# Altium footprint library IntLib.PcbLib: 221 footprints (part 9 of 14)
Each footprint in its own frame and in the unit in brackets; x right, y up, seen from the top. Pads: shape width x height; smd on the part's side, far side on the other; paste and mask are expansions set on the pad; w line width, h text height; cw(c..) or ccw(c..) is an arc to the next point about the centre after c.
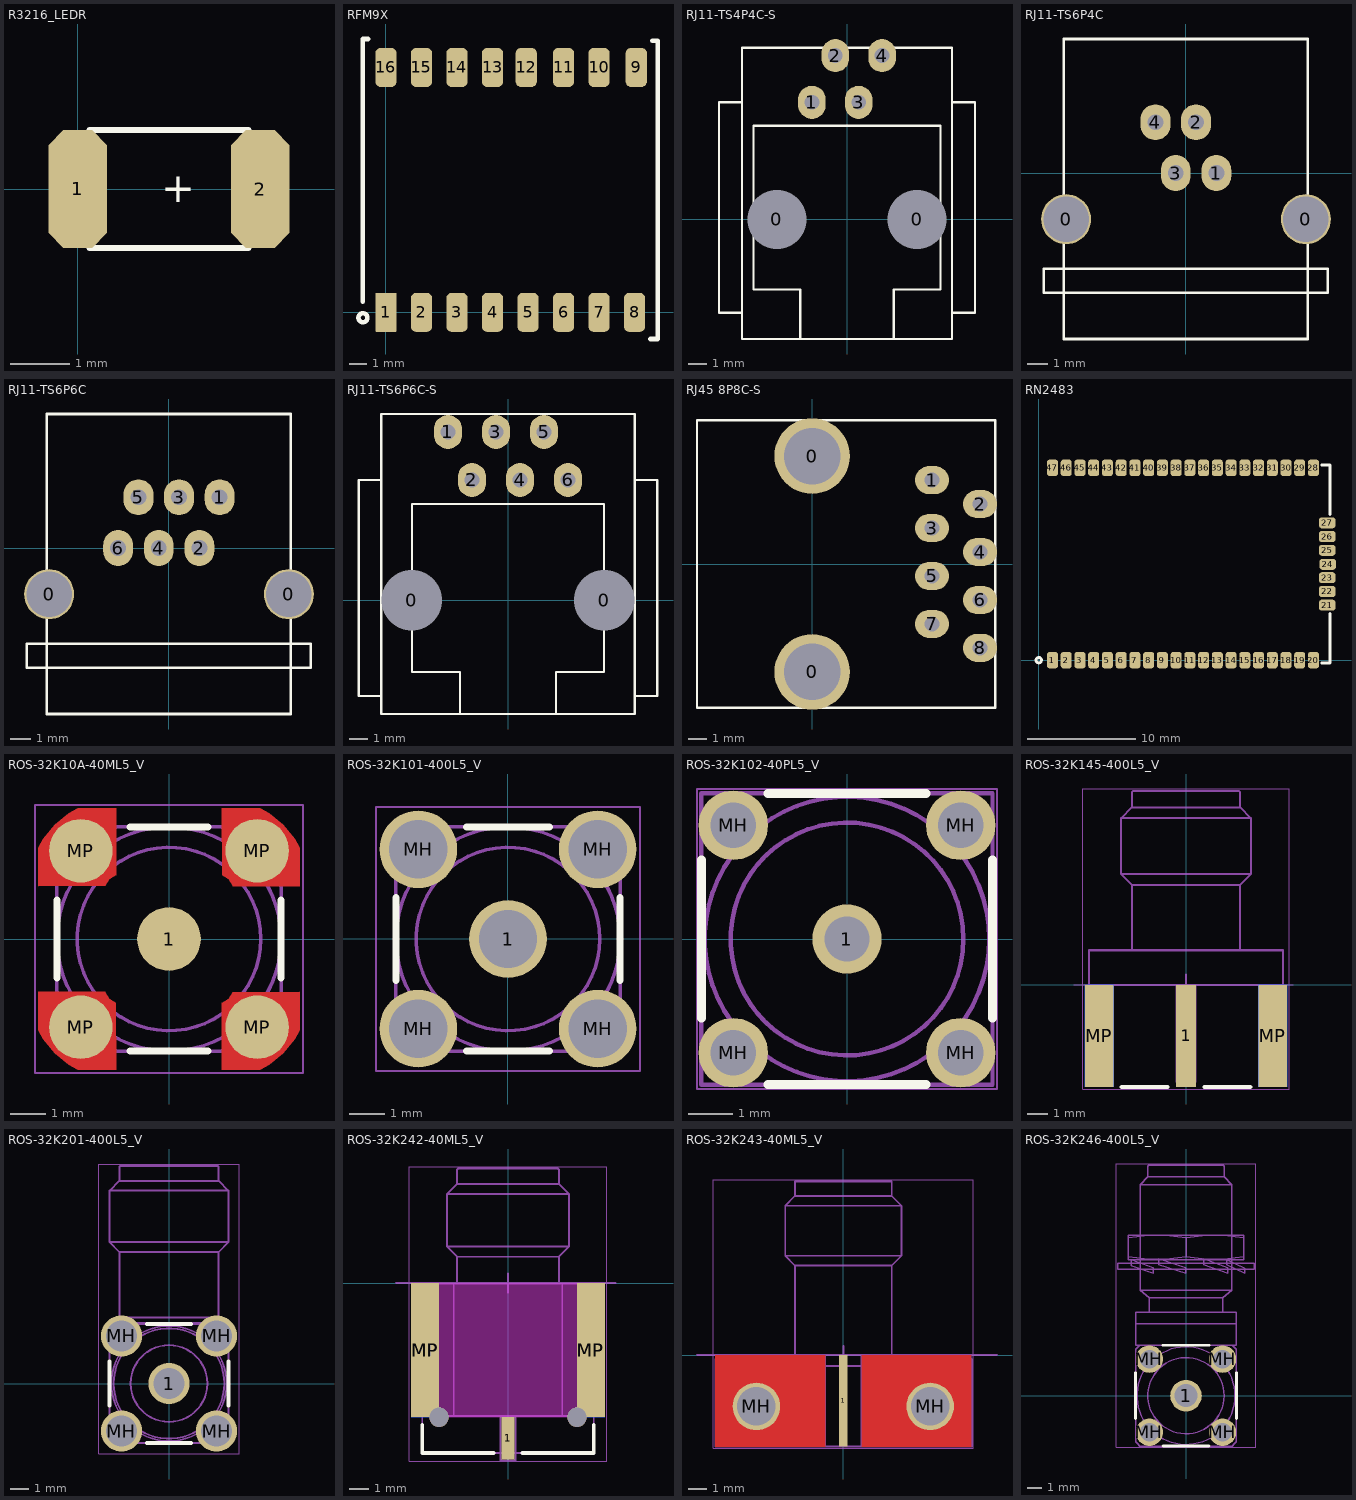
[diagram p8: the footprints below, top view; thin cyan lines are the x and y axes]

## R3216_LEDR [mm] "1206"
pads (2):
  oct 1x2 smd: 1(0,0) 2(3.1,0)
Top Overlay:
  lines w0.1: 0.2,-1 0.2,0 0.2,1 2.9,1 2.9,-1 0.2,-1
  text "+" at 1.422,-0.229 h0.5
3D body: height 1.11, standoff -0.4, extent -0.1,-0.8 3.1,0.8

## RFM9X [mm] "RFM95/96/97/98 Lora Hope RF 433/868"
pads (16):
  rrect10% 1.2x2.2 smd: 1(0,0)
  rrect50% 1.2x2.2 smd: 2(2,0) 3(4,0) 4(6,0) 5(8,0) 6(10,0) 7(12,0) 8(14,0) 9(14.1,13.8) 10(12,13.8) 11(10,13.8) 12(7.9,13.8) 13(6,13.8) 14(4,13.8) 15(2,13.8) 16(0,13.8)
Top Overlay:
  circle w0.254: c-1.3,-0.3 r0.254
  lines w0.254: -1.3,0.6 -1.3,15.4 -1,15.4 ; 14.9,-1.5 15.3,-1.5 15.3,15.3 15,15.3
3D body: height 2.29, standoff 0.06, extent -0.9,-1.1 15,14.902

## RJ11-TS4P4C-S [mm]
pads (6):
  round 3 hole 3.2: 0(-3.81,0) 0(3.81,0)
  oval 1.5x1.8 hole 0.8: 1(-1.905,6.35) 2(-0.635,8.89) 3(0.635,6.35) 4(1.905,8.89)
Top Overlay:
  lines w0.127: -5.7,-5.08 -6.95,-5.08 -6.95,6.35 -5.7,6.35 ; -2.54,-6.5 -2.54,-3.81 -5.08,-3.81 -5.08,5.08 5.08,5.08 5.08,-3.81 2.54,-3.81 2.54,-6.5 ; 5.7,-5.08 6.95,-5.08 6.95,6.35 5.7,6.35 ; -5.7,-6.5 -5.7,9.322 5.7,9.322 5.7,-6.5 -5.7,-6.5
3D body: height 16.31, standoff -4.92, extent -6.858,-6.553 6.858,9.322

## RJ11-TS6P4C [mm]
pads (6):
  round 2.5 hole 2.286: 0(-5.986,-2.311) 0(6.013,-2.311)
  oval 1.5x1.8 hole 0.8: 1(1.532,0) 2(0.516,2.54) 3(-0.5,0) 4(-1.516,2.54)
Top Overlay:
  lines w0.127: -7.099,-5.994 -7.099,-4.801 7.099,-4.801 7.099,-5.994 -7.099,-5.994 ; -6.096,-8.306 6.096,-8.306 6.096,6.706 -6.096,6.706 -6.096,-8.306
3D body: height 14.5, standoff -3.5, extent -7.182,-8.3 7.218,4.7

## RJ11-TS6P6C [mm]
pads (8):
  round 2.5 hole 2.286: 0(-5.986,-2.311) 0(6.013,-2.311)
  oval 1.5x1.8 hole 0.8: 1(2.548,2.54) 2(1.532,0) 3(0.516,2.54) 4(-0.5,0) 5(-1.516,2.54) 6(-2.532,0)
Top Overlay:
  lines w0.127: -7.099,-5.994 -7.099,-4.801 7.099,-4.801 7.099,-5.994 -7.099,-5.994 ; -6.096,-8.306 6.096,-8.306 6.096,6.706 -6.096,6.706 -6.096,-8.306
3D body: height 14.5, standoff -3.5, extent -7.182,-8.3 7.218,4.7

## RJ11-TS6P6C-S [mm]
pads (8):
  round 3 hole 3.2: 0(-5.08,0) 0(5.08,0)
  oval 1.5x1.8 hole 0.8: 1(-3.175,8.89) 2(-1.905,6.35) 3(-0.635,8.89) 4(0.635,6.35) 5(1.905,8.89) 6(3.175,6.35)
Top Overlay:
  lines w0.127: -6.7,-5.08 -7.9,-5.08 -7.9,6.35 -6.7,6.35 ; -2.54,-6.03 -2.54,-3.81 -5.08,-3.81 -5.08,5.08 5.08,5.08 5.08,-3.81 2.54,-3.81 2.54,-6.03 ; 6.7,-5.08 7.9,-5.08 7.9,6.35 6.7,6.35 ; -6.7,-6.03 6.7,-6.03 6.7,9.84 -6.7,9.84 -6.7,-6.03
3D body: height 15.02, standoff -3.92, extent -7.875,-6.03 7.875,9.84

## RJ45 8P8C-S [mm]
pads (10):
  round 4 hole 3: 0(0,-5.715) 0(0,5.715)
  oval 1.8x1.5 hole 0.8: 1(6.35,4.445) 2(8.89,3.175) 3(6.35,1.905) 4(8.89,0.635) 5(6.35,-0.635) 6(8.89,-1.905) 7(6.35,-3.175) 8(8.89,-4.445)
Top Overlay:
  lines w0.127: -6.1,-7.62 9.7,-7.62 9.7,7.62 -6.1,7.62 -6.1,-7.62
3D body: height 16.3, standoff -3.3, extent -6.1,-7.75 9.7,7.75

## RN2483 [mil] "RN2483"
pads (47):
  rrect50% 40x60 smd: 1(50,0) 2(100,0) 3(150,0) 4(200,0) 5(250,0) 6(300,0) 7(350,0) 8(400,0) 9(450,0) 10(500,0) 11(550,0) 12(600,0) 13(650,0) 14(700,0) 15(750,0) 16(800,0) 17(850,0) 18(900,0) 19(950,0) 20(1000,0) 28(1000,700) 29(950,700) 30(900,700) 31(850,700) 32(800,700) 33(750,700) 34(700,700) 35(650,700) 36(600,700) 37(550,700) 38(500,700) 39(450,700) 40(400,700) 41(350,700) 42(300,700) 43(250,700) 44(200,700) 45(150,700) 46(100,700) 47(50,700)
  rrect50% 60x40 smd: 21(1050,200) 22(1050,250) 23(1050,300) 24(1052,349) 25(1050,400) 26(1050,450) 27(1050,500)
Top Overlay:
  circle w10: c0,0 r10
  lines w10: 1030,-10 1060,-10 1060,170 ; 1030,710 1060,710 1060,530
3D body: height 131.5, standoff -0.04, extent 2,-1 1052,699

## ROS-32K10A-40ML5_V [mm] "SMA Straight Jack, Press-Fit, 6.35x6.35x9.5mm, Rosenberger Recommended"
height 9.5
pads (5):
  round 1.8 smd: 1(0,0) MP(-2.5,-2.5) MP(-2.5,2.5) MP(2.5,-2.5) MP(2.5,2.5)
Top Layer:
  region: 1.504,1.81 1.688,1.687 1.81,1.504 1.8,1.5 3.7,1.5 3.7,2.587 3.565,2.84 3.238,3.238 2.84,3.565 2.587,3.7 1.5,3.7
  region: -1.81,1.504 -1.687,1.688 -1.504,1.81 -1.5,1.8 -1.5,3.7 -2.587,3.7 -2.84,3.565 -3.238,3.238 -3.565,2.84 -3.7,2.587 -3.7,1.5
  region: -1.504,-1.81 -1.688,-1.687 -1.81,-1.504 -1.8,-1.5 -3.7,-1.5 -3.7,-2.587 -3.565,-2.84 -3.238,-3.238 -2.84,-3.565 -2.587,-3.7 -1.5,-3.7
  region: 1.81,-1.504 1.687,-1.688 1.504,-1.81 1.5,-1.8 1.5,-3.7 2.587,-3.7 2.84,-3.565 3.238,-3.238 3.565,-2.84 3.7,-2.587 3.7,-1.5
Top Overlay:
  lines w0.2: -3.175,-1.1 -3.175,1.1 ; -1.1,-3.175 1.1,-3.175 ; -1.1,3.175 1.1,3.175 ; 3.175,-1.1 3.175,1.1
Mechanical 13:
  circle w0.1: c0,0 r0.635
  circle w0.1: c0,0 r2.6
  circle w0.1: c0,0 r3.175
  lines w0.1: -3.188,-2.811 ccw(c0,0) -2.811,-3.188 ; -3.188,2.811 cw(c0,0) -2.811,3.188 ; -3.175,-2.8 -3.175,2.8 ; -3.175,-1.9 -1.9,-1.9 -1.9,-3.175 ; -3.175,1.9 -1.9,1.9 -1.9,3.175 ; -2.8,-3.175 2.8,-3.175 ; -2.8,3.175 2.8,3.175 ; -0.1,-0.627 -0.1,0.627 ; 0.1,-0.627 0.1,0.627 ; 1.9,-3.175 1.9,-1.9 3.175,-1.9 ; 1.9,3.175 1.9,1.9 3.175,1.9 ; 2.811,-3.188 ccw(c0,0) 3.188,-2.811 ; 2.811,3.188 cw(c0,0) 3.188,2.811 ; 3.175,-2.8 3.175,2.8
Mechanical 15:
  lines w0.05: -3.8,-3.8 -3.8,3.8 3.8,3.8 3.8,-3.8 -3.8,-3.8
  lines w0.1: -0.5,0 0.5,0 ; 0,-0.5 0,0.5
3D body: height 9.5, standoff 0, extent -3.175,-3.175 3.175,3.175

## ROS-32K101-400L5_V [mm] "SMA Straight Jack, 6.35x6.35x9.5mm, Rosenberger Recommended"
height 9.5
pads (5):
  round 2.2 hole 1.65: 1(0,0) MH(-2.54,-2.54) MH(-2.54,2.54) MH(2.54,-2.54) MH(2.54,2.54)
Top Overlay:
  lines w0.2: -3.175,-1.181 -3.175,1.181 ; -1.181,-3.175 1.181,-3.175 ; -1.181,3.175 1.181,3.175 ; 3.175,-1.181 3.175,1.181
Mechanical 13:
  circle w0.1: c0,0 r3.175
  circle w0.1: c0,0 r2.6
  circle w0.1: c0,0 r0.635
  lines w0.1: -3.19,-2.808 ccw(c0,0) -2.808,-3.191 ; -3.19,2.808 cw(c0,0) -2.808,3.19 ; -3.175,-2.794 -3.175,2.794 ; -3.04,-2.97 -3.04,-2.04 -2.04,-2.04 -2.04,-3.04 -2.97,-3.04 ; -3.04,2.97 -3.04,2.04 -2.04,2.04 -2.04,3.04 -2.97,3.04 ; -2.794,-3.175 2.794,-3.175 ; -2.794,3.175 2.794,3.175 ; -0.1,-0.627 -0.1,0.627 ; 0.1,-0.627 0.1,0.627 ; 2.808,-3.191 ccw(c0,0) 3.191,-2.808 ; 2.808,3.19 cw(c0,0) 3.191,2.808 ; 2.97,3.04 2.04,3.04 2.04,2.04 3.04,2.04 3.04,2.97 ; 2.97,-3.04 2.04,-3.04 2.04,-2.04 3.04,-2.04 3.04,-2.97 ; 3.175,-2.794 3.175,2.794
Mechanical 15:
  lines w0.05: -3.74,-3.74 -3.74,3.74 3.74,3.74 3.74,-3.74 -3.74,-3.74
  lines w0.1: -0.635,0 0.508,0 ; 0,-0.508 0,0.635
3D body: height 9.5, standoff -4, extent -3.175,-3.175 3.175,3.175

## ROS-32K102-40PL5_V [mm] "SMA Straight Jack, 6.5x6.5x9.5mm, Rosenberger Recommended"
height 9.5
pads (5):
  round 1.55 hole 1.015: 1(0,0) MH(-2.54,-2.54) MH(-2.54,2.54) MH(2.54,-2.54) MH(2.54,2.54)
Top Overlay:
  lines w0.2: -3.25,-1.767 -3.25,1.767 ; -1.767,-3.25 1.767,-3.25 ; -1.767,3.25 1.767,3.25 ; 3.25,-1.767 3.25,1.767
Mechanical 13:
  circle w0.1: c0,0 r0.635
  circle w0.1: c0,0 r2.6
  circle w0.1: c0,0 r3.175
  lines w0.1: -0.1,-0.627 -0.1,0.627 ; 0.1,-0.627 0.1,0.627 ; -2.84,-2.84 -2.729,-3.14 -2.351,-3.14 -2.24,-2.84 ; -2.84,-2.84 -2.665,-2.665 ; -2.84,-2.84 -2.84,-2.24 ; -2.84,-2.84 -2.24,-2.84 ; -2.84,-2.24 -2.729,-1.94 -2.351,-1.94 -2.24,-2.24 ; -2.84,-2.24 -2.24,-2.24 ; -2.84,-2.24 -2.665,-2.415 ; -2.84,2.24 -2.729,1.94 -2.351,1.94 -2.24,2.24 ; -2.84,2.24 -2.24,2.24 ; -2.84,2.24 -2.665,2.415 ; -2.84,2.24 -2.84,2.84 ; -2.84,2.84 -2.729,3.14 -2.351,3.14 -2.24,2.84 ; -2.84,2.84 -2.665,2.665 ; -2.84,2.84 -2.24,2.84 ; -2.665,-2.665 -2.415,-2.665 ; -2.665,-2.665 -2.665,-2.415 ; -2.665,-2.415 -2.415,-2.415 ; -2.665,2.415 -2.665,2.665 ; -2.665,2.415 -2.415,2.415 ; -2.665,2.665 -2.415,2.665 ; -2.415,-2.665 -2.24,-2.84 ; -2.415,-2.665 -2.415,-2.415 ; -2.415,-2.415 -2.24,-2.24 ; -2.415,2.415 -2.24,2.24 ; -2.415,2.415 -2.415,2.665 ; -2.415,2.665 -2.24,2.84 ; -2.24,-2.84 -2.24,-2.24 ; -2.24,2.24 -2.24,2.84 ; 2.24,-2.84 2.351,-3.14 2.729,-3.14 2.84,-2.84 ; 2.24,-2.84 2.24,-2.24 ; 2.24,-2.84 2.84,-2.84 ; 2.24,-2.84 2.415,-2.665 ; 2.24,-2.24 2.351,-1.94 2.729,-1.94 2.84,-2.24 ; 2.24,-2.24 2.415,-2.415 ; 2.24,-2.24 2.84,-2.24 ; 2.24,2.24 2.24,2.84 ; 2.24,2.24 2.84,2.24 ; 2.24,2.24 2.415,2.415 ; 2.24,2.24 2.351,1.94 2.729,1.94 2.84,2.24 ; 2.24,2.84 2.415,2.665 ; 2.24,2.84 2.84,2.84 ; 2.24,2.84 2.351,3.14 2.729,3.14 2.84,2.84 ; 2.415,-2.665 2.665,-2.665 ; 2.415,-2.665 2.415,-2.415 ; 2.415,-2.415 2.665,-2.415 ; 2.415,2.415 2.415,2.665 ; 2.415,2.415 2.665,2.415 ; 2.415,2.665 2.665,2.665 ; 2.665,-2.665 2.84,-2.84 ; 2.665,-2.665 2.665,-2.415 ; 2.665,-2.415 2.84,-2.24 ; 2.665,2.415 2.665,2.665 ; 2.665,2.415 2.84,2.24 ; 2.665,2.665 2.84,2.84 ; 2.84,-2.84 2.84,-2.24 ; 2.84,2.24 2.84,2.84 ; -3.25,-3.25 3.25,-3.25 3.25,3.25 -3.25,3.25 -3.25,-3.25
Mechanical 15:
  lines w0.05: -3.35,-3.35 -3.35,3.35 3.35,3.35 3.35,-3.35 -3.35,-3.35
  lines w0.1: -0.5,0 0.5,0 ; 0,-0.5 0,0.5
3D body: height 9.5, standoff -2.8, extent -3.25,-3.25 3.25,3.25

## ROS-32K145-400L5_V [mm] "SMA Right Angle Jack, Edge Mount, 14.25x9.5x4.46mm, Rosenberger Recommended"
height 4.46
pads (5):
  rect 1x5 smd: 1(0,-2.5)
  rect 1.4x5 smd: MP(-4.25,-2.5) MP(4.25,-2.5)
  rect 1.4x5 smd far side paste-2: ""(-4.25,-2.5) ""(4.25,-2.5)
Top Overlay:
  lines w0.2: -3.15,-5 -0.9,-5 ; 0.9,-5 3.15,-5
Mechanical 3:
  lines w0.05: -5.5,0 5.25,0
  text "Board Edge" at -8.1,0 h0.2
Mechanical 13:
  lines w0.1: -3.75,0 -3.75,-4.75 -4.75,-4.75 -4.75,0 ; -2.65,1.7 -2.65,4.9 ; -0.46,0 -0.46,-4.75 0.46,-4.75 0.46,0 ; 2.65,1.7 2.65,4.9 ; 3.75,0 3.75,-4.75 4.75,-4.75 4.75,0 ; -4.75,0 -4.75,1.7 4.75,1.7 4.75,0 ; -4.75,0 4.75,0 ; -3.175,5.425 3.175,5.425 ; -3.175,5.425 -2.65,4.9 ; -3.175,5.425 -3.175,8.175 ; -3.175,8.175 -2.65,8.7 ; -3.175,8.175 3.175,8.175 ; -2.65,4.9 2.65,4.9 ; -2.65,8.7 2.65,8.7 ; -2.65,8.7 -2.65,9.45 -2.6,9.5 2.6,9.5 2.65,9.45 2.65,8.7 ; 2.65,4.9 3.175,5.425 ; 2.65,8.7 3.175,8.175 ; 3.175,5.425 3.175,8.175
Mechanical 15:
  lines w0.05: -5.05,-5.1 -5.05,9.6 5.05,9.6 5.05,-5.1 -5.05,-5.1
  lines w0.1: -0.5,0 0.5,0 ; 0,-0.5 0,0.5
3D body: height 4.46, standoff -3.7, extent -4.75,-4.75 4.75,9.5

## ROS-32K201-400L5_V [mm] "SMA Right Angle Jack, 14.8x6.35x9.6mm, Rosenberger Recommended"
height 9.6
pads (5):
  round 2.2 hole 1.65: 1(0,0) MH(-2.54,-2.54) MH(-2.54,2.54) MH(2.54,-2.54) MH(2.54,2.54)
Top Overlay:
  lines w0.2: -3.175,-1.181 -3.175,1.181 ; -1.181,-3.175 1.181,-3.175 ; -1.181,3.175 1.181,3.175 ; 3.175,-1.181 3.175,1.181
Mechanical 13:
  circle w0.1: c0,0 r2.05
  circle w0.1: c0,0 r2.95
  circle w0.1: c0,0 r0.635
  circle w0.1: c0,0 r3.075
  lines w0.05: -2.9,3.275 2.9,3.275
  lines w0.1: -3.175,2.9 cw(c0,0) -2.9,3.175 -2.9,3.275 -2.65,3.525 ; -3.175,2.905 -3.175,-2.9 ccw(c0,0) -2.9,-3.175 2.9,-3.175 ccw(c0,0) 3.175,-2.9 3.175,2.9 ccw(c0,0) 2.9,3.175 ; -2.905,3.175 2.9,3.175 ; -3.175,7.55 3.175,7.55 ; -3.175,7.55 -2.65,7.025 ; -3.175,7.55 -3.175,10.3 ; -3.175,10.3 3.175,10.3 ; -3.175,10.3 -2.65,10.825 ; -2.65,3.525 2.65,3.525 ; -2.65,3.525 -2.65,7.025 ; -2.65,7.025 2.65,7.025 ; -2.65,10.825 2.65,10.825 ; -2.65,10.825 -2.65,11.575 -2.6,11.625 -2.375,11.625 2.375,11.625 2.6,11.625 2.65,11.575 2.65,10.825 ; 2.65,3.525 2.65,7.025 ; 2.65,3.525 2.9,3.275 2.9,3.175 ; 2.65,7.025 3.175,7.55 ; 2.65,10.825 3.175,10.3 ; 3.175,7.55 3.175,10.3 ; -3.04,-3.04 -2.04,-3.04 -2.04,-2.04 -3.04,-2.04 -3.04,-3.04 ; -3.04,2.04 -3.04,3.04 -2.04,3.04 -2.04,2.04 -3.04,2.04 ; 2.04,-3.04 3.04,-3.04 3.04,-2.04 2.04,-2.04 2.04,-3.04 ; 2.04,2.04 2.04,3.04 3.04,3.04 3.04,2.04 2.04,2.04
Mechanical 15:
  lines w0.05: -3.74,-3.74 -3.74,11.725 3.74,11.725 3.74,-3.74 -3.74,-3.74
  lines w0.1: -0.5,0 0.5,0 ; 0,-0.5 0,0.5
3D body: height 9.6, standoff -3.9, extent -3.175,-3.175 3.175,11.625

## ROS-32K242-40ML5_V [mm] "SMA Right Angle Jack, Edge Mount, 14.84x8.944x4.00mm, Rosenberger Recommended"
height 4
pads (5):
  rect 0.7x2.2 smd: 1(0,-8.1)
  rect 1.45x7 smd: MP(-4.325,-3.5) MP(4.325,-3.5)
  rect 1.45x7 smd far side paste-2: MP(-4.325,-3.5) MP(4.325,-3.5)
via 3.6,-7 diameter 1 hole 1
via -3.6,-7 diameter 1 hole 1
Top Overlay:
  lines w0.2: -4.472,-7.4 -4.472,-8.869 -0.75,-8.869 ; 0.75,-8.869 4.472,-8.869 4.472,-7.4
Keep-Out Layer:
  board cut-out: -3.6,-7 3.6,-7 3.6,0 -3.6,0
Mechanical 3:
  lines w0.1: -5.85,0 5.6,0
  text "Board Edge" at -8.244,0.027 h0.2
  text "Plated Edge" at -3.5,-4.75 h0.2
  text "Unplated Edge" at -1.143,-7 h0.2
  text "Plated Edge" at 3.65,-4.65 h0.2
Mechanical 13:
  lines w0.1: -2.828,-6.929 -2.828,-0.029 ; -2.65,-0.029 -2.65,1.371 ; -0.395,-6.929 -0.395,-9.25 0.395,-9.25 0.395,-6.929 ; 2.65,-0.029 2.65,1.371 ; 2.829,-6.929 2.829,-0.029 ; -4.472,-6.929 -4.472,-8.869 4.472,-8.869 4.472,-6.929 ; -4.472,-6.929 -4.472,-0.029 4.472,-0.029 4.472,-6.929 ; -4.472,-6.929 4.472,-6.929 ; -3.175,1.896 -2.65,1.371 ; -3.175,1.896 -3.175,4.646 ; -3.175,1.896 3.175,1.896 ; -3.175,4.646 -2.65,5.171 ; -3.175,4.646 3.175,4.646 ; -2.65,1.371 2.65,1.371 ; -2.65,5.171 -2.65,5.921 -2.6,5.971 2.6,5.971 2.65,5.921 2.65,5.171 ; -2.65,5.171 2.65,5.171 ; 2.65,1.371 3.175,1.896 ; 2.65,5.171 3.175,4.646 ; 3.175,1.896 3.175,4.646
Mechanical 15:
  lines w0.05: -5.15,-9.3 -5.15,6.071 5.15,6.071 5.15,-9.3 -5.15,-9.3
  lines w0.1: -0.5,0 0.5,0 ; 0,-0.5 0,0.5
3D body: height 4, standoff -3, extent -4.472,-8.869 4.472,5.971

## ROS-32K243-40ML5_V [mm] "SMA Jack, Right Angle, Edge Mount Screw On, 14.50x14.00x5.15mm, Rosenberger Recommended"
height 5.15
pads (3):
  rect 0.48x5 smd: 1(0,-2.5)
  round 2.6 hole 2.1: MH(-4.75,-2.8) MH(4.75,-2.8)
Top Layer:
  region: -1,0 -4.75,0 -4.75,-1.741 -5.024,-1.777 -5.28,-1.883 -5.499,-2.051 -5.667,-2.27 -5.773,-2.526 -5.809,-2.8 -5.773,-3.074 -5.667,-3.33 -5.499,-3.549 -5.28,-3.717 -5.024,-3.823 -4.75,-3.859 -4.476,-3.823 -4.22,-3.717 -4.001,-3.549 -3.833,-3.33 -3.727,-3.074 -3.691,-2.8 -3.727,-2.526 -3.833,-2.27 -4.001,-2.051 -4.22,-1.883 -4.476,-1.777 -4.75,-1.741 -4.75,-1.75 -4.75,0 -7,0 -7,-5 -1,-5
  region: 1,0 4.75,0 4.75,-1.741 5.024,-1.777 5.28,-1.883 5.499,-2.051 5.667,-2.27 5.773,-2.526 5.809,-2.8 5.773,-3.074 5.667,-3.33 5.499,-3.549 5.28,-3.717 5.024,-3.823 4.75,-3.859 4.476,-3.823 4.22,-3.717 4.001,-3.549 3.833,-3.33 3.727,-3.074 3.691,-2.8 3.727,-2.526 3.833,-2.27 4.001,-2.051 4.22,-1.883 4.476,-1.777 4.75,-1.741 4.75,-1.75 4.75,0 7,0 7,-5 1,-5
Bottom Layer:
  region: 1,0 4.75,0 4.75,-1.741 5.024,-1.777 5.28,-1.883 5.499,-2.051 5.667,-2.27 5.773,-2.526 5.809,-2.8 5.773,-3.074 5.667,-3.33 5.499,-3.549 5.28,-3.717 5.024,-3.823 4.75,-3.859 4.476,-3.823 4.22,-3.717 4.001,-3.549 3.833,-3.33 3.727,-3.074 3.691,-2.8 3.727,-2.526 3.833,-2.27 4.001,-2.051 4.22,-1.883 4.476,-1.777 4.75,-1.741 4.75,-1.75 4.75,0 7,0 7,-5 1,-5
  region: -1,0 -4.75,0 -4.75,-1.741 -5.024,-1.777 -5.28,-1.883 -5.499,-2.051 -5.667,-2.27 -5.773,-2.526 -5.809,-2.8 -5.773,-3.074 -5.667,-3.33 -5.499,-3.549 -5.28,-3.717 -5.024,-3.823 -4.75,-3.859 -4.476,-3.823 -4.22,-3.717 -4.001,-3.549 -3.833,-3.33 -3.727,-3.074 -3.691,-2.8 -3.727,-2.526 -3.833,-2.27 -4.001,-2.051 -4.22,-1.883 -4.476,-1.777 -4.75,-1.741 -4.75,-1.75 -4.75,0 -7,0 -7,-5 -1,-5
Mechanical 3:
  lines w0.1: -8,0 8.4,0
  text "Board Edge" at -10.5,0.1 h0.2
Mechanical 13:
  circle w0.1: c4.75,-2.8 r1.89
  circle w0.1: c-4.75,-2.8 r1.89
  lines w0.1: -7,-0.6 7,-0.6 ; -6.458,-5 -6.458,-0.2 ; -2.65,-0.2 -2.65,4.9 ; -1,-5 -1,-0.2 ; -1,-0.6 1,-0.6 ; -0.125,0 -0.125,-0.79 0.125,-0.79 0.125,0 ; 1,-5 1,-0.2 ; 2.65,-0.2 2.65,4.9 ; 6.458,-5 6.458,-0.2 ; -6.458,-0.2 -7,-0.2 -7,-5 7,-5 7,-0.2 6.458,-0.2 ; -6.458,-0.2 -1,-0.2 ; -3.18,5.43 3.18,5.43 ; -3.18,5.43 -3.18,8.17 ; -3.18,5.43 -2.65,4.9 ; -3.18,8.17 3.18,8.17 ; -3.18,8.17 -2.65,8.7 ; -2.65,4.9 2.65,4.9 ; -2.65,8.7 2.65,8.7 ; -2.65,8.7 -2.65,9.5 2.65,9.5 2.65,8.7 ; -1,-0.2 -1,0 1,0 1,-0.2 ; 1,-0.2 6.458,-0.2 ; 2.65,4.9 3.18,5.43 ; 2.65,8.7 3.18,8.17 ; 3.18,5.43 3.18,8.17 ; -5.616,-2.8 -5.183,-2.05 -4.317,-2.05 -3.884,-2.8 -4.317,-3.55 -5.183,-3.55 -5.616,-2.8 ; 3.884,-2.8 4.317,-3.55 5.183,-3.55 5.616,-2.8 5.183,-2.05 4.317,-2.05 3.884,-2.8
Mechanical 15:
  lines w0.05: -7.1,-5.1 -7.1,9.6 7.1,9.6 7.1,-5.1 -7.1,-5.1
  lines w0.1: -0.5,0 0.5,0 ; 0,-0.5 0,0.5
3D body: height 5.15, standoff -4.85, extent -7,-5 7,9.5

## ROS-32K246-400L5_V [mm] "SMA Right Angle Jack, Panel Mount, 19.50x9.50x10.00mm, Rosenberger Recommended"
height 10
pads (5):
  round 2.2 hole 1.6: 1(0,0)
  round 1.9 hole 1.3: MH(-2.54,-2.54) MH(-2.54,2.54) MH(2.54,-2.54) MH(2.54,2.54)
Top Overlay:
  lines w0.2: -3.5,-1.591 -3.5,1.591 ; -1.591,-3.5 1.591,-3.5 ; -1.591,3.5 1.591,3.5 ; 3.5,-1.591 3.5,1.591
Mechanical 13:
  circle w0.1: c0,0 r2.65
  circle w0.1: c0,0 r3.4
  circle w0.1: c0,0 r0.635
  lines w0.1: -4,9.652 -3.439,9.575 -2.887,9.521 -2,9.486 -1.113,9.521 -0.561,9.575 0,9.652 ; -4,10.984 -3.439,11.061 -2.887,11.115 -2,11.15 -1.113,11.115 -0.561,11.061 0,10.984 ; -3.501,-3.21 ccw(c0,0) -3.21,-3.501 ; -3.501,3.21 cw(c0,0) -3.21,3.501 ; -3.5,-3.211 -3.5,3.211 ; -3.211,-3.5 3.211,-3.5 ; -2.56,5.8 -2.56,6.8 ; 1.231,9.5 2.899,8.9 2.899,8.5 1.231,9.11 1.231,9.51 ; 2.56,5.8 2.56,6.8 ; 3.21,-3.501 ccw(c0,0) 3.501,-3.21 ; 3.21,3.501 cw(c0,0) 3.501,3.21 ; 3.5,-3.211 3.5,3.209 ; 4,9.652 3.439,9.575 2.887,9.521 2,9.486 1.113,9.521 0.561,9.575 0,9.652 ; 4,10.984 3.439,11.061 2.887,11.115 2,11.15 1.113,11.115 0.561,11.061 0,10.984 ; -3.5,5 -3.5,5.8 3.5,5.8 3.5,5 ; -3.5,5 3.5,5 ; -3.5,5 -3.5,3.5 -3.211,3.5 ; -3.211,3.5 3.209,3.5 3.5,3.5 3.5,5 ; -3.175,7.325 3.175,7.325 ; -3.175,7.325 -2.56,6.8 ; -3.175,7.325 -3.175,14.675 ; -3.175,14.675 3.175,14.675 ; -3.175,14.675 -2.65,15.2 ; -2.65,15.2 2.65,15.2 ; -2.65,15.2 -2.65,15.95 -2.6,16 2.6,16 2.65,15.95 2.65,15.2 ; -2.56,6.8 2.56,6.8 ; 0,9.652 0,10.984 ; 2.56,6.8 3.175,7.325 ; 2.65,15.2 3.175,14.675 ; 3.175,7.325 3.175,14.675 ; -4.75,8.8 4.75,8.8 4.75,9.2 -4.75,9.2 -4.75,8.8 ; -4,9.45 -4,11.15 4,11.15 4,9.45 -4,9.45 ; -3.82,9.016 -2.263,8.5 -2.263,8.9 -3.81,9.45 -3.82,9.016 ; -2.94,-2.94 -2.14,-2.94 -2.14,-2.14 -2.94,-2.14 -2.94,-2.94 ; -2.94,2.14 -2.94,2.94 -2.14,2.94 -2.14,2.14 -2.94,2.14 ; -1.895,9.1 0,8.5 0,8.9 -1.895,9.5 -1.895,9.1 ; 2.14,-2.94 2.94,-2.94 2.94,-2.14 2.14,-2.14 2.14,-2.94 ; 2.14,2.14 2.14,2.94 2.94,2.94 2.94,2.14 2.14,2.14 ; 2.838,9.1 4.1,8.5 4.1,8.85 2.838,9.45 2.838,9.1
Mechanical 15:
  lines w0.05: -4.85,-3.6 -4.85,16.1 4.85,16.1 4.85,-3.6 -4.85,-3.6
  lines w0.1: -0.5,0 0.5,0 ; 0,-0.5 0,0.5
3D body: height 10, standoff -4, extent -4.75,-3.5 4.75,16